# Altium footprint library Dr.Xiong_20160818.PcbLib: 266 footprints (part 5 of 17)
Each footprint in its own frame and in the unit in brackets; x right, y up, seen from the top. Pads: shape width x height; smd on the part's side, far side on the other; paste and mask are expansions set on the pad; w line width, h text height; cw(c..) or ccw(c..) is an arc to the next point about the centre after c.
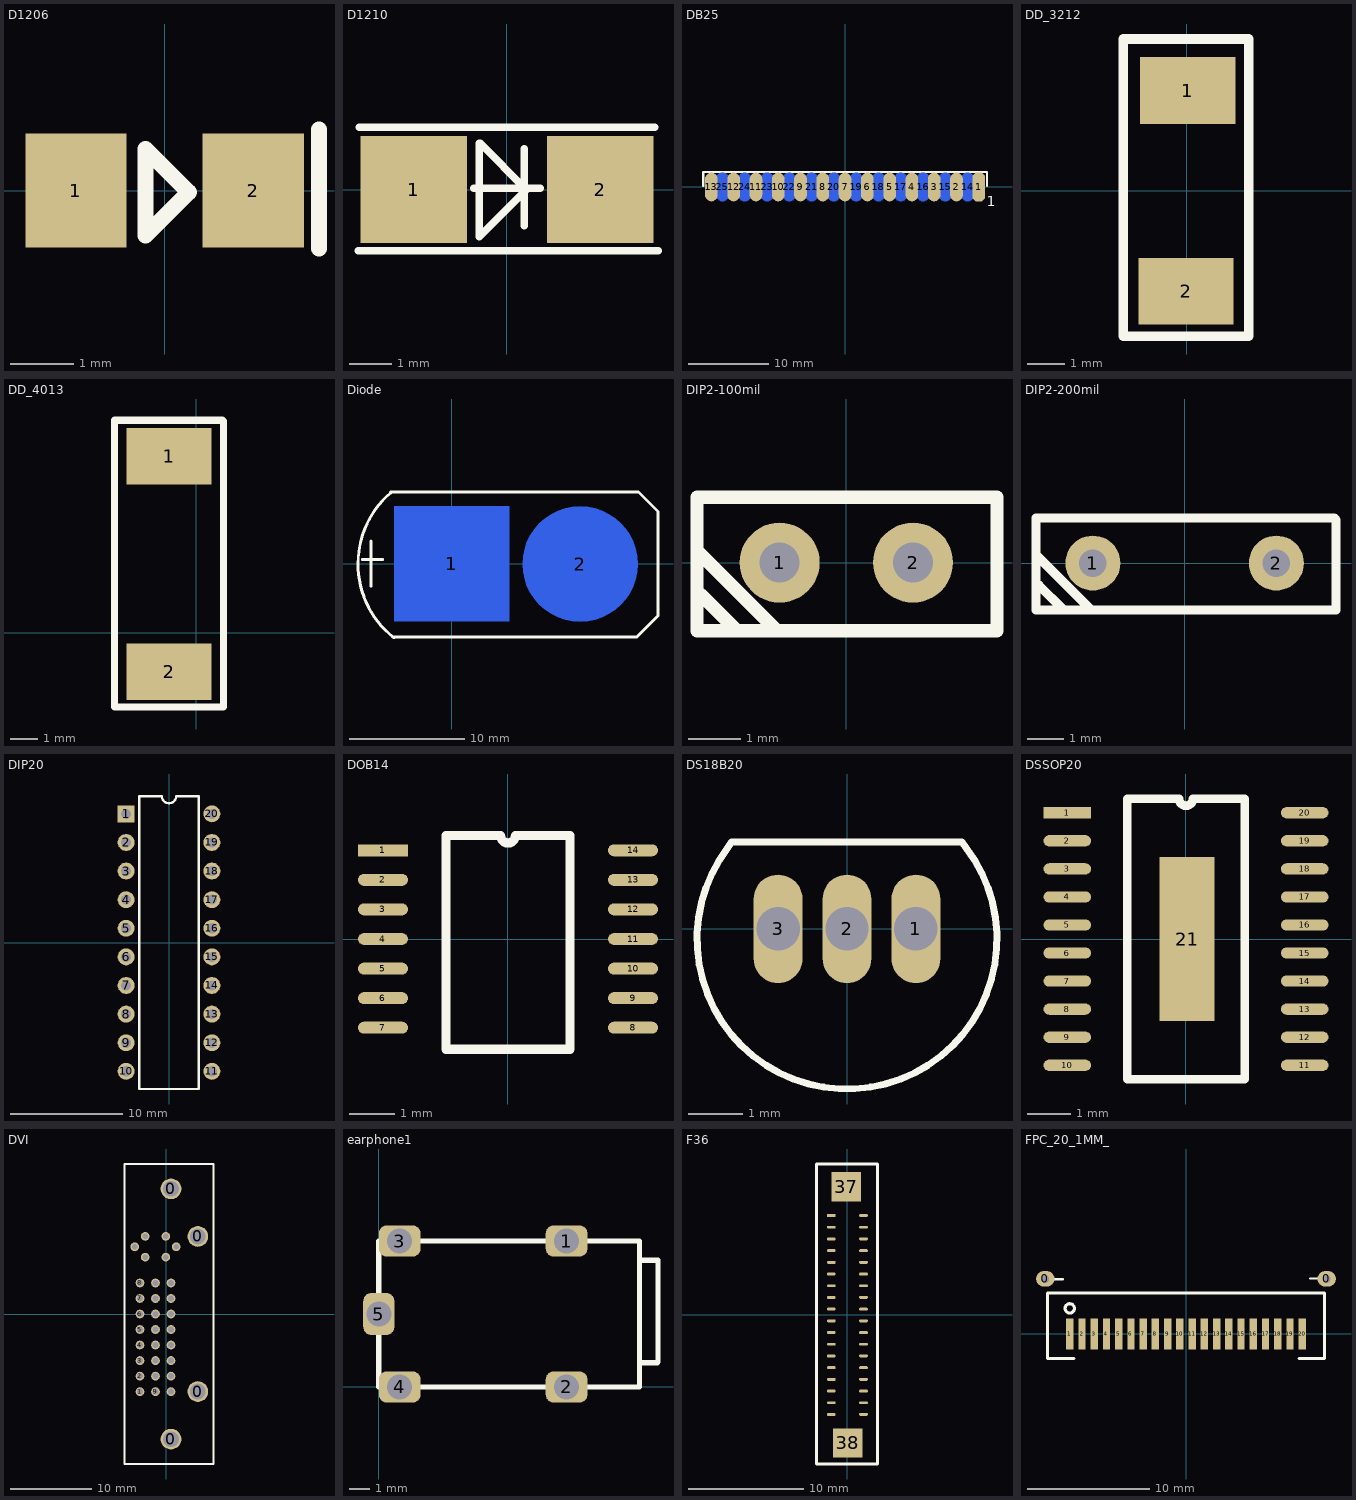
[diagram p4: the footprints below, top view; thin cyan lines are the x and y axes]

## D1206 [mm]
pads (2):
  rect 1.6x1.8 smd: 1(-1.4,0) 2(1.4,0)
Top Overlay:
  lines w0.254: 2.438,-0.914 2.438,0.965 ; -0.305,-0.711 0.381,-0.025 -0.305,0.66 -0.305,-0.711

## D1210 [mil]
pads (2):
  rect 99.37x100 smd: 1(-87,0) 2(87.19,0)
Top Overlay:
  lines w7: -139,-57 141,-57 ; -138,58 138,58 ; -31,1 31,1 ; -26,43 -26,-44 18,0 ; -25,43 18,0 ; 16,-34 16,38 ; 17,0 18,0

## DB25 [mil]
pads (25):
  oct 62.5x141.67 smd: 1(660,0)
  oval 62.5x141.67 smd: 2(550,0) 3(440,0) 4(330,0) 5(220,0) 6(110,0) 7(0,0) 8(-110,0) 9(-220,0) 10(-330,0) 11(-440,0) 12(-550,0) 13(-660,0)
  oval 62.5x141.67 smd far side: 14(605,0) 15(495,0) 16(385,0) 17(275,0) 18(165,0) 19(55,0) 20(-55,0) 21(-165,0) 22(-275,0) 23(-385,0) 24(-495,0) 25(-605,0)
Top Overlay:
  lines w10: -700,5 -700,75 700,75 700,5
  text "1" at 700,-95 h50
Bottom Overlay:
  text "25" at -735,-25 h50

## DD_3212 [mm]
pads (2):
  rect 2.54x1.778 smd: 1(0.025,2.675) 2(-0.025,-2.675)
Top Overlay:
  lines w0.254: -1.7,-3.875 -1.7,4.05 1.65,4.05 1.65,-3.875 -1.7,-3.875

## DD_4013 [mm]
pads (2):
  rect 3.048x2.032 smd: 1(-0.975,6.325) 2(-0.975,-1.4)
Top Overlay:
  lines w0.254: -2.925,-2.675 -2.925,7.625 0.95,7.625 0.975,7.6 0.975,-2.675 -2.925,-2.675

## Diode [mm]
pads (2):
  rect 10x10 smd far side: 1(0,0)
  round 10 smd far side: 2(11.151,-0.025)
Top Overlay:
  lines w0.254: -7.772,0.356 -5.994,0.356 ; -7.01,-1.956 -7.01,1.981 ; -5.309,6.223 16.205,6.223 17.907,4.521 17.907,-4.521 16.078,-6.35 -5.156,-6.35 ; -5.291,6.165 ccw(c0,-0.025) -5.035,-6.426

## DIP2-100mil [mil]
pads (2):
  round 60 hole 30: 1(-50,0) 2(50,0)
Top Overlay:
  lines w10: -112,-24 -109,-24 -82,-51 ; -112,11 -112,9 -52,-51 ; 105,49 -112,49 -112,-51 113,-51 113,41 ; 106,49 113,49 113,39

## DIP2-200mil [mil]
pads (2):
  round 60 hole 30: 1(-100,0) 2(100,0)
Top Overlay:
  lines w10: -162,-24 -159,-24 -132,-51 ; -162,11 -162,9 -102,-51 ; 55,49 -162,49 -162,-51 155,-51 165,-51 165,47 163,49 61,49 ; 56,49 63,49

## DIP20 [mm]
pads (20):
  rect 1.5x1.5 hole 0.9: 1(-3.81,11.43)
  round 1.5 hole 0.9: 2(-3.81,8.89) 3(-3.81,6.35) 4(-3.81,3.81) 5(-3.81,1.27) 6(-3.81,-1.27) 7(-3.81,-3.81) 8(-3.81,-6.35) 9(-3.81,-8.89) 10(-3.81,-11.43) 11(3.81,-11.43) 12(3.81,-8.89) 13(3.81,-6.35) 14(3.81,-3.81) 15(3.81,-1.27) 16(3.81,1.27) 17(3.81,3.81) 18(3.81,6.35) 19(3.81,8.89) 20(3.81,11.43)
Top Overlay:
  lines w0.2: -2.65,-13 2.65,-13 2.65,13 0.635,13 cw(c0,13) -0.635,13 -2.65,13 -2.65,-13

## DOB14 [mm]
pads (14):
  rect 1.1x0.26 smd: 1(-2.75,1.95)
  oval 1.1x0.26 smd: 2(-2.75,1.3) 3(-2.75,0.65) 4(-2.75,0) 5(-2.75,-0.65) 6(-2.75,-1.3) 7(-2.75,-1.95) 8(2.75,-1.95) 9(2.75,-1.3) 10(2.75,-0.65) 11(2.75,0) 12(2.75,0.65) 13(2.75,1.3) 14(2.75,1.95)
Top Overlay:
  lines w0.2: -1.365,-2.425 1.365,-2.425 1.365,2.275 0.162,2.275 cw(c0,2.275) -0.163,2.275 -1.365,2.275 -1.365,-2.425

## DS18B20 [mm]
pads (3):
  oval 0.9x2 hole 0.8: 1(1.27,0) 2(0,0) 3(-1.27,0)
Top Overlay:
  lines w0.127: -2.349,1.271 ccw(c0,-0.186) 2.349,1.271 2.12,1.6 -2.13,1.6 -2.35,1.27

## DSSOP20 [mm]
pads (21):
  rect 1.1x0.26 smd: 1(-2.75,2.925)
  oval 1.1x0.26 smd: 2(-2.75,2.275) 3(-2.75,1.625) 4(-2.75,0.975) 5(-2.75,0.325) 6(-2.75,-0.325) 7(-2.75,-0.975) 8(-2.75,-1.625) 9(-2.75,-2.275) 10(-2.75,-2.925) 11(2.75,-2.925) 12(2.75,-2.275) 13(2.75,-1.625) 14(2.75,-0.975) 15(2.75,-0.325) 16(2.75,0.325) 17(2.75,0.975) 18(2.75,1.625) 19(2.75,2.275) 20(2.75,2.925)
  rect 1.27x3.81 smd: 21(0.025,0)
Top Overlay:
  lines w0.2: -1.365,-3.25 1.365,-3.25 1.365,3.25 0.163,3.25 cw(c0,3.25) -0.162,3.25 -1.365,3.25 -1.365,-3.25

## DVI [mm]
pads (34):
  round 2.54 hole 1.93: 0(0.575,-15.365) 0(0.575,15.365) 0(3.875,-9.525) 0(3.875,9.525)
  round 1.067 hole 0.7: 1(-3.235,-9.525) 2(-3.235,-7.62) 3(-3.235,-5.715) 4(-3.235,-3.81) 5(-3.235,-1.905) 6(-3.235,0) 7(-3.235,1.905) 9(-1.33,-9.525) 10(-1.33,-7.62) 11(-1.33,-5.715) 12(-1.33,-3.81) 13(-1.33,-1.905) 14(-1.33,0) 15(-1.33,1.905) 16(-1.33,3.81) 17(0.575,-9.525) 18(0.575,-7.62) 19(0.575,-5.715) 20(0.575,-3.81) 21(0.575,-1.905) 22(0.575,0) 23(0.575,1.905) 24(0.575,3.81)
  round 1.067 hole 0.762: 8(-3.235,3.81)
  round 1.067 hole 0.66: C1(-2.602,6.985) C2(-2.602,9.525) C3(-0.062,6.985) C4(-0.062,9.525) C5(-3.875,8.255) C5(1.205,8.255)
Top Overlay:
  lines w0.254: -5.145,-18.415 -5.145,18.415 5.805,18.415 5.805,-18.415 -5.145,-18.415

## earphone1 [mm]
pads (5):
  rrect50% 2x1.5 hole 1.2: 1(9,7) 2(9,0) 3(1,7) 4(1,0)
  rrect50% 1.5x2 hole 1.2: 5(0,3.5)
Top Overlay:
  lines w0.254: 12.5,1.168 13.36,1.168 13.386,1.194 13.386,6.071 12.5,6.071 ; 0,0 12.5,0 12.5,7 0,7 0,0

## F36 [mil]
pads (38):
  rect 30x10 smd: 1(-55,339.57)
  oval 30x10 smd: 2(55,339.57) 3(-55,299.57) 4(55,299.57) 5(-55,259.57) 6(55,259.57) 7(-55,219.57) 8(55,219.57) 9(-55,179.57) 10(55,179.57) 11(-55,139.57) 12(55,139.57) 13(-55,99.57) 14(55,99.57) 15(-55,59.57) 16(55,59.57) 17(-55,19.57) 18(55,19.57) 19(-55,-20.43) 20(55,-20.43) 21(-55,-60.43) 22(55,-60.43) 23(-55,-100.43) 24(55,-100.43) 25(-55,-140.43) 26(55,-140.43) 27(-55,-180.43) 28(55,-180.43) 29(-55,-220.43) 30(55,-220.43) 31(-55,-260.43) 32(55,-260.43) 33(-55,-300.43) 34(55,-300.43) 35(-55,-340.43) 36(55,-340.43)
  rect 100x100 smd: 37(-3.82,437.99) 38(1.1,-437.99)
Top Overlay:
  lines w10: -106.18,-509.84 -106.18,515.75 103.46,515.75 103.46,361.22 103.46,-509.84 -106.18,-509.84

## FPC_20_1MM_ [mm]
pads (22):
  oval 1.524x1.27 hole 0.635: 0(-11.5,4.5) 0(11.5,4.5)
  rect 0.6x2.5 smd: 1(-9.5,0) 2(-8.5,0) 3(-7.5,0) 4(-6.5,0) 5(-5.5,0) 6(-4.5,0) 7(-3.5,0) 8(-2.5,0) 9(-1.5,0) 10(-0.5,0) 11(0.5,0) 12(1.5,0) 13(2.5,0) 14(3.5,0) 15(4.5,0) 16(5.5,0) 17(6.5,0) 18(7.5,0) 19(8.5,0) 20(9.5,0)
Top Overlay:
  circle w0.254: c-9.5,2.091 r0.381
  lines w0.178: -11.496,4.47 -10.058,4.47 ; 10.135,4.521 11.42,4.521
  lines w0.254: -9.169,-1.999 -11.328,-1.999 -11.328,3.335 11.328,3.335 11.328,-1.999 ; 9.246,-1.999 11.303,-1.999